# Altium footprint library cool_library.PcbLib: 1182 footprints (part 10 of 75)
Each footprint in its own frame and in the unit in brackets; x right, y up, seen from the top. Pads: shape width x height; smd on the part's side, far side on the other; paste and mask are expansions set on the pad; w line width, h text height; cw(c..) or ccw(c..) is an arc to the next point about the centre after c.
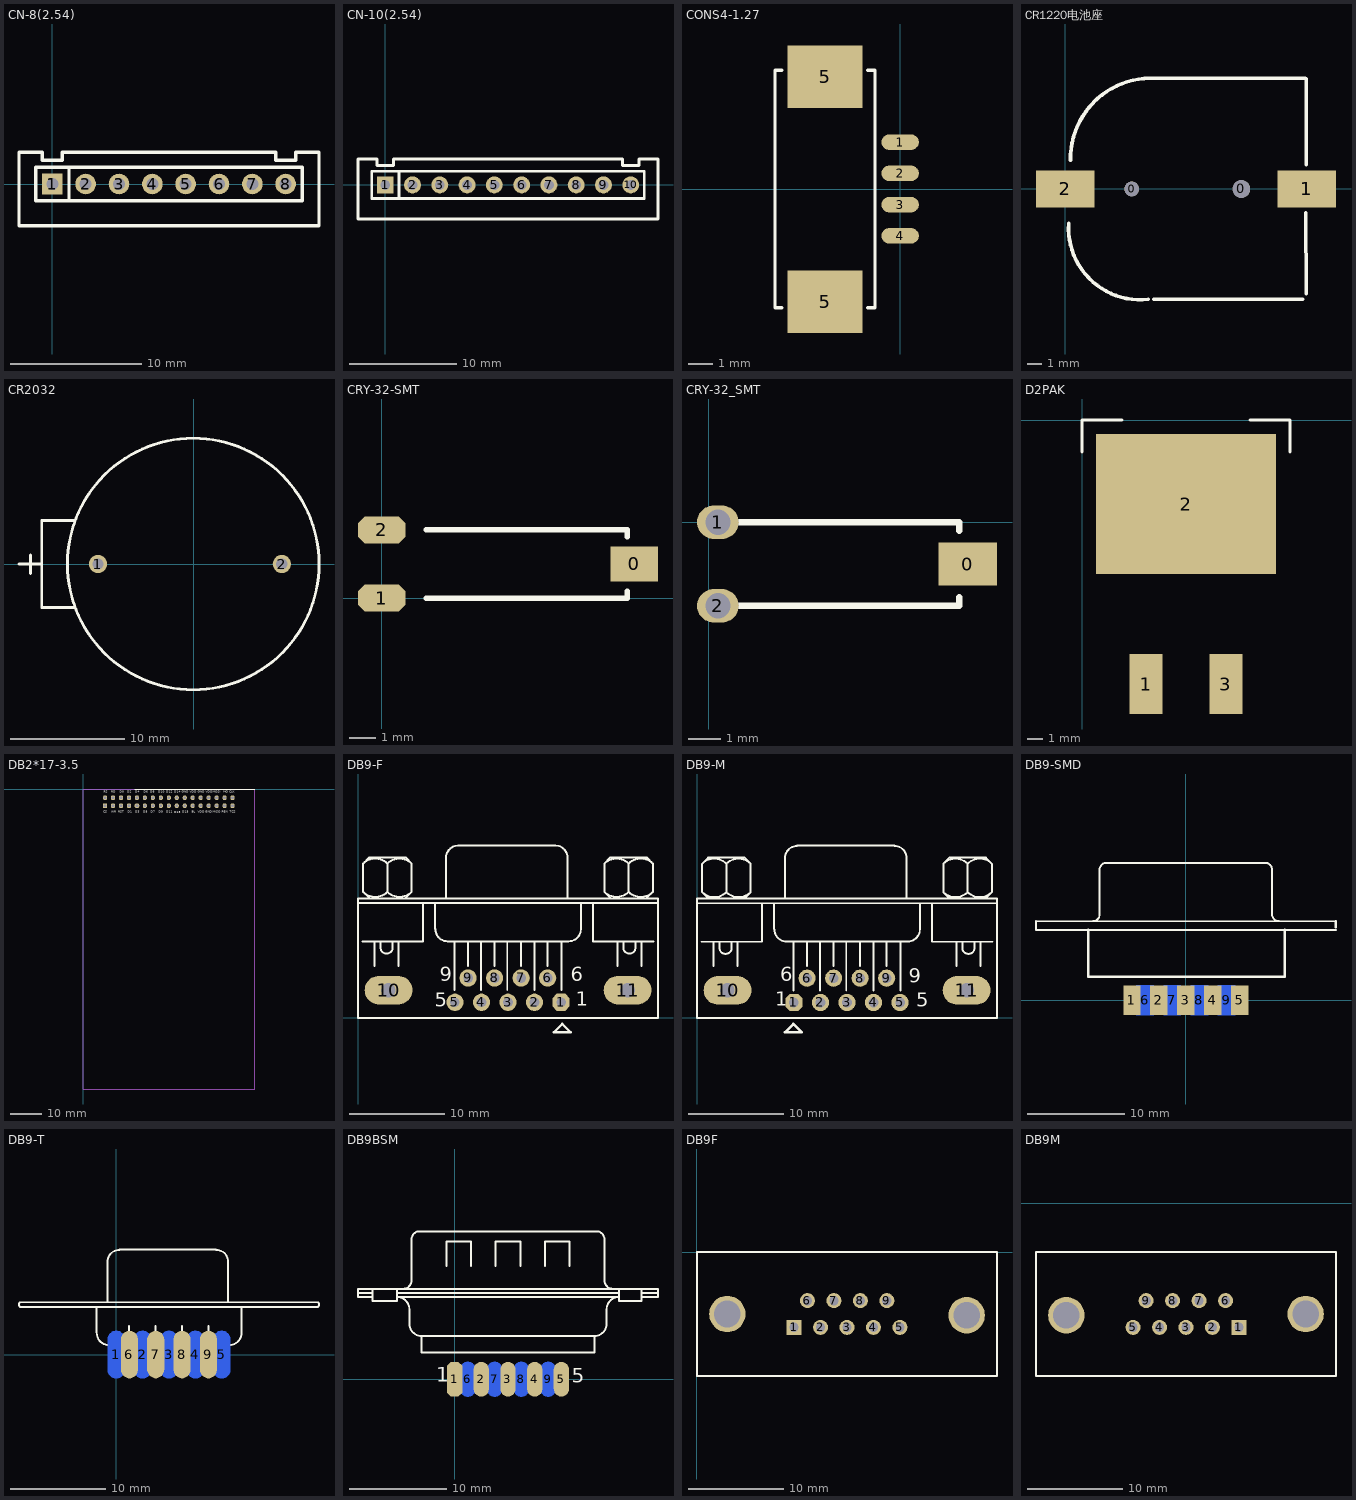
[diagram p9: the footprints below, top view; thin cyan lines are the x and y axes]

## CN-8(2.54) [mil]
pads (8):
  rect 62x62 hole 36: 1(0,0)
  round 62 hole 36: 2(100,0) 3(200,0) 4(300,0) 5(400,0) 6(500,0) 7(600,0) 8(700,0)
Top Overlay:
  lines w10: 50,-50 50,50 ; -100,-125 -100,95 -30,95 -30,71 30,71 30,95 670,95 670,71 730,71 730,95 800,95 800,-125 -100,-125 ; -50,-50 -50,50 750,50 750,-50 -50,-50

## CN-10(2.54) [mil]
pads (10):
  rect 62x62 hole 36: 1(0,0)
  round 62 hole 36: 2(100,0) 3(200,0) 4(300,0) 5(400,0) 6(500,0) 7(600,0) 8(700,0) 9(800,0) 10(900,0)
Top Overlay:
  lines w10: 50,-50 50,50 ; -100,-125 -100,95 -30,95 -30,71 30,71 30,95 870,95 870,71 930,71 930,95 1000,95 1000,-125 -100,-125 ; -50,-50 -50,50 950,50 950,-50 -50,-50

## CONS4-1.27 [mil]
height 135
pads (6):
  oval 60x25 smd: 1(0,75) 2(0,25) 3(0,-25) 4(0,-75)
  rect 120x100 smd: 5(-120,-180) 5(-120,180)
Top Overlay:
  lines w5: -189,-190 -200,-190 -200,190 -189,190 ; -52,-190 -40,-190 -40,190 -52,190

## CR1220电池座 [mm]
pads (4):
  round 1 hole 1: 0(4.547,0)
  round 1.2 hole 1.2: 0(12.04,0)
  rect 4x2.5 smd: 1(16.5,0) 2(0,0)
Top Overlay:
  lines w0.254: 0.229,-2.362 ccw(c5.134,-2.657) 5.666,-7.542 ; 0.356,1.981 cw(c5.867,2.057) 5.791,7.569 16.408,7.569 16.459,7.518 16.459,1.676 ; 6.045,-7.544 16.214,-7.544 ; 16.434,-1.626 16.459,-7.137

## CR2032 [mm]
pads (2):
  round 1.6 hole 1: 1(-8.382,0) 2(7.7,0)
Top Overlay:
  circle w0.254: c-0.05,0 r11
  lines w0.254: -15.291,0 -13.3,0 ; -14.3,-0.838 -14.3,0.787 ; -10.5,-3.8 -13.3,-3.8 -13.3,3.8 -10.5,3.8

## CRY-32-SMT [mil]
pads (3):
  rect 70x52 smd: 0(370,50)
  oct 70x40 smd: 1(0,0) 2(0,100)
Top Overlay:
  lines w8: 65,0 360,0 360,10 ; 65,100 360,100 360,90

## CRY-32_SMT [mil]
pads (3):
  rect 70x52 smd: 0(310,-50)
  oval 50x40 hole 30: 1(11,0) 2(11,-100)
Top Overlay:
  lines w8: 5,-100 300,-100 300,-90 ; 5,0 300,0 300,-10

## D2PAK [mil]
pads (3):
  rect 82x150 smd: 1(160,-660) 3(360,-660)
  rect 450x350 smd: 2(260,-210)
Top Overlay:
  lines w8: 0,-80 0,0 100,0 ; 420,0 520,0 520,-80

## DB2*17-3.5 [mil]
pads (34):
  rect 51.18x62 hole 35: 1(275,-210)
  oval 51.18x62 hole 35: 2(275,-110) 3(375,-210) 4(375,-110) 5(475,-210) 6(475,-110) 7(575,-210) 8(575,-110) 10(675,-110) 11(775,-210) 12(775,-110) 13(875,-210) 14(875,-110) 15(975,-210) 16(975,-110) 17(1075,-210) 18(1075,-110) 19(1175,-210) 20(1175,-110) 21(1275,-210) 22(1275,-110) 23(1375,-210) 24(1375,-110) 25(1475,-210) 26(1475,-110) 27(1575,-210) 28(1575,-110) 29(1675,-210) 30(1675,-110) 31(1775,-210) 32(1775,-110) 33(1875,-210) 34(1875,-110)
  round 62 hole 35: 9(675,-210)
Top Overlay:
  lines w10: 650,0 2155,0
  text "BL" at 1360,-300 h28
  text "MISO" at 1625,-300 h28.03
  text "TCS" at 1840,-300 h28.03
  text "MO" at 1757.28,-48.58 h28.03
  text "MOSI" at 1629.33,-48.58 h28.03
  text "CLK" at 1836.02,-48.58 h28.03
  text "PEN" at 1740,-300 h28.03
  text "D11" at 1045,-300 h28
  text "GND" at 1535,-300 h28
  text "GND" at 1240.55,-48.58 h28
  text "RD" at 354.72,-48.58 h28
  text "D0" at 458.07,-48.58 h28
  text "D10" at 940.35,-48.58 h28
  text "VDD" at 1338.98,-48.58 h28
  text "GND" at 1437.4,-48.58 h28
  text "VDD" at 1540.75,-48.58 h28
  text "VDD" at 1440,-300 h28
  text "D15" at 1245,-300 h28
  text "D12" at 1043.7,-48.58 h28
  text "D13" at 1142.13,-304.49 h28
  text "D9" at 950,-300 h28
  text "D8" at 841.93,-48.58 h28
  text "D6" at 758.27,-48.58 h28
  text "D5" at 755,-300 h28
  text "D4" at 654.92,-48.58 h28
  text "D3" at 655,-300 h28
  text "D2" at 556.5,-48.58 h28
  text "D1" at 560,-300 h28
  text "RST" at 440,-300 h28
  text "WR" at 355,-300 h28
  text "CS" at 255,-300 h28
  text "RS" at 256.3,-48.58 h28
  text "D7" at 850,-300 h28
  text "D14" at 1142.13,-48.58 h28
Bottom Overlay:
  lines w6: 225,-160 325,-160 325,-260 ; 225,-260 1925,-260 1925,-60 225,-60 225,-260
  lines w8: 235,-330 1925,-330
  text "CLK" at 1835,-275 h35
  text "TCS" at 1835,-350 h35
  text "NC" at 1750,-275 h35
  text "PEN" at 1725,-350 h35
  text "MO" at 1650,-275 h35
  text "MI" at 1655,-350 h35
  text "V5" at 1560,-275 h35
  text "GND" at 1530,-350 h35
  text "GND" at 1450,-275 h35
  text "VDD" at 1425,-350 h35
  text "VDD" at 1345,-275 h35
  text "BL" at 1350,-350 h35
  text "GND" at 1240,-275 h35
  text "D15" at 1240,-350 h35
  text "D14" at 1140,-275 h35
  text "D13" at 1135,-350 h35
  text "D12" at 1035,-275 h35
  text "D11" at 1035,-350 h35
  text "D10" at 935,-275 h35
  text "D9" at 945,-350 h35
  text "D8" at 850,-275 h35
  text "D7" at 850,-350 h35
  text "D6" at 755,-275 h35
  text "D5" at 755,-350 h35
  text "D4" at 650,-275 h35
  text "D3" at 650,-350 h35
  text "D2" at 550,-275 h35
  text "D1" at 555,-350 h35
  text "RST" at 435,-350 h35
  text "D0" at 450,-275 h35
  text "WR" at 350,-350 h35
  text "RD" at 350,-275 h35
  text "RS" at 245,-275 h35
  text "CS" at 240,-350 h35
Mechanical 7:
  lines w10: 650,0 0,0 0,-3765 2155,-3765 2155,0
3D body: height 200, standoff 0, extent 1845.31,-142 1905.08,-82.12
3D body: height 200, standoff 0, extent 1846.31,-241 1906.08,-181.12
3D body: height 200, standoff 0, extent 1042.31,-241 1102.08,-181.12
3D body: height 200, standoff 0, extent 1143.31,-241 1203.08,-181.12
3D body: height 200, standoff 0, extent 1242.31,-241 1302.08,-181.12
3D body: height 200, standoff 0, extent 1544.31,-242 1604.08,-182.12
3D body: height 200, standoff 0, extent 1445.31,-242 1505.08,-182.12
3D body: height 200, standoff 0, extent 1344.31,-242 1404.08,-182.12
3D body: height 200, standoff 0, extent 1744.31,-242 1804.08,-182.12
3D body: height 200, standoff 0, extent 1643.31,-242 1703.08,-182.12
3D body: height 200, standoff 0, extent 1642.31,-143 1702.08,-83.12
3D body: height 200, standoff 0, extent 1743.31,-143 1803.08,-83.12
3D body: height 200, standoff 0, extent 1343.31,-143 1403.08,-83.12
3D body: height 200, standoff 0, extent 1444.31,-143 1504.08,-83.12
3D body: height 200, standoff 0, extent 1543.31,-143 1603.08,-83.12
3D body: height 200, standoff 0, extent 1241.31,-142 1301.08,-82.12
3D body: height 200, standoff 0, extent 1142.31,-142 1202.08,-82.12
3D body: height 200, standoff 0, extent 1041.31,-142 1101.08,-82.12
3D body: height 200, standoff 0, extent 245.31,-239 305.08,-179.12
3D body: height 200, standoff 0, extent 346.31,-239 406.08,-179.12
3D body: height 200, standoff 0, extent 445.31,-239 505.08,-179.12
3D body: height 200, standoff 0, extent 747.31,-240 807.08,-180.12
3D body: height 200, standoff 0, extent 648.31,-240 708.08,-180.12
3D body: height 200, standoff 0, extent 547.31,-240 607.08,-180.12
3D body: height 200, standoff 0, extent 947.31,-240 1007.08,-180.12
3D body: height 200, standoff 0, extent 846.31,-240 906.08,-180.12
3D body: height 200, standoff 0, extent 845.31,-141 905.08,-81.12
3D body: height 200, standoff 0, extent 946.31,-141 1006.08,-81.12
3D body: height 200, standoff 0, extent 546.31,-141 606.08,-81.12
3D body: height 200, standoff 0, extent 647.31,-141 707.08,-81.12
3D body: height 200, standoff 0, extent 746.31,-141 806.08,-81.12
3D body: height 200, standoff 0, extent 444.31,-140 504.08,-80.12
3D body: height 200, standoff 0, extent 345.31,-140 405.08,-80.12
3D body: height 200, standoff 0, extent 244.31,-140 304.08,-80.12
3D body: height 10, standoff 0, extent 230,-255 1925,-65.18

## DB9-F [mm]
pads (11):
  oct 1.8x1.8 hole 1: 1(21.209,1.626)
  round 1.8 hole 1: 2(18.436,1.626) 3(15.663,1.626) 4(12.89,1.626) 5(10.118,1.626) 6(19.812,4.166) 7(17.039,4.166) 8(14.266,4.166) 9(11.493,4.166)
  oval 5x3 hole 1.5: 10(3.175,2.896) 11(28.173,2.896)
Top Overlay:
  lines w0.203: 0,12 31.327,12 ; 0.423,7.976 6.773,7.976 6.773,12 ; 0.506,13.163 ccw(c1.778,14.436) 3.05,13.163 ; 0.506,16.131 cw(c1.778,14.859) 3.05,16.131 ; 1.143,12.531 0.508,13.166 0.508,16.129 1.143,16.764 4.953,16.764 5.588,16.129 ; 1.693,5.436 1.693,7.976 ; 2.328,7.976 2.328,7.341 ccw(c2.963,7.341) 3.598,7.341 3.598,7.976 ; 3.044,16.125 3.048,13.166 ; 3.046,13.163 ccw(c4.318,14.436) 5.59,13.163 ; 3.046,16.131 cw(c4.318,14.859) 5.59,16.131 5.588,13.166 4.953,12.531 ; 4.233,5.436 4.233,7.976 ; 8.043,9.296 8.043,12 ; 8.069,9.271 ccw(c9.339,9.271) 9.339,8.001 ; 9.186,12.522 9.186,16.789 ; 9.186,16.739 cw(c10.456,16.739) 10.456,18.009 ; 9.313,8 22.013,8 ; 10.058,2.896 10.058,8 ; 10.456,18 20.616,18 ; 11.464,5.436 11.464,8 ; 12.861,2.896 12.861,8 ; 14.266,5.436 14.266,8 ; 15.587,2.896 15.587,8 ; 17.018,5.436 17.018,8 ; 18.415,2.896 18.415,8 ; 19.795,5.436 19.795,8 ; 20.616,18.009 cw(c20.616,16.739) 21.886,16.739 ; 21.268,2.896 21.268,8 ; 21.886,12.522 21.886,16.789 ; 22.013,8.001 ccw(c22.013,9.271) 23.283,9.271 ; 23.283,9.246 23.283,12 ; 24.553,12 24.553,7.976 30.903,7.976 ; 25.736,13.163 ccw(c27.009,14.436) 28.281,13.163 ; 25.739,16.129 26.374,16.764 30.184,16.764 30.819,16.129 30.819,13.166 30.184,12.531 ; 26.374,12.531 25.739,13.166 25.736,16.131 cw(c27.009,14.859) 28.281,16.131 ; 27.093,5.436 27.093,7.976 ; 27.728,7.976 27.728,7.341 ccw(c28.363,7.341) 28.998,7.341 28.998,7.976 ; 28.276,13.163 ccw(c29.549,14.436) 30.821,13.163 ; 28.276,16.131 cw(c29.549,14.859) 30.821,16.131 ; 28.279,13.166 28.283,16.125 ; 29.633,5.436 29.633,7.976 ; 0,0 0,12.5 31.327,12.5 31.327,0 0,0
  lines w0.254: 20.447,-1.524 22.225,-1.524 21.336,-0.635 20.447,-1.524
  text "6" at 22.225,3.81 h1.5
  text "1" at 22.733,1.27 h1.5
  text "5" at 8.001,1.143 h1.5
  text "9" at 8.509,3.81 h1.5

## DB9-M [mm]
pads (11):
  oct 1.8x1.8 hole 1: 1(10.092,1.6)
  round 1.8 hole 1: 2(12.865,1.6) 3(15.638,1.6) 4(18.411,1.6) 5(21.184,1.6) 6(11.468,4.14) 7(14.241,4.14) 8(17.014,4.14) 9(19.787,4.14)
  oval 5x3 hole 1.5: 10(3.15,2.87) 11(28.147,2.87)
Top Overlay:
  lines w0.203: -0.025,11.975 31.301,11.975 ; 0.398,7.95 6.748,7.95 6.748,11.975 ; 0.48,13.138 ccw(c1.753,14.41) 3.025,13.138 ; 0.48,16.106 cw(c1.753,14.834) 3.025,16.106 ; 1.118,12.505 0.483,13.14 0.483,16.104 1.118,16.739 4.928,16.739 5.563,16.104 ; 1.668,5.41 1.668,7.95 ; 2.303,7.95 2.303,7.315 ccw(c2.938,7.315) 3.573,7.315 3.573,7.95 ; 3.018,16.1 3.023,13.14 ; 3.02,13.138 ccw(c4.293,14.41) 5.565,13.138 ; 3.02,16.106 cw(c4.293,14.834) 5.565,16.106 5.563,13.14 4.928,12.505 ; 4.208,5.41 4.208,7.95 ; 8.018,9.271 8.018,11.975 ; 8.043,9.246 ccw(c9.313,9.246) 9.313,7.976 ; 9.161,12.497 9.161,16.764 ; 9.161,16.713 cw(c10.431,16.713) 10.431,17.983 ; 9.288,7.975 21.988,7.975 ; 10.033,2.87 10.033,7.975 ; 10.431,18 20.591,18 ; 11.438,5.41 11.438,7.975 ; 12.835,2.87 12.835,7.975 ; 14.241,5.41 14.241,7.975 ; 15.562,2.87 15.562,7.975 ; 16.993,5.41 16.993,7.975 ; 18.39,2.87 18.39,7.975 ; 19.77,5.41 19.77,7.975 ; 20.591,17.983 cw(c20.591,16.713) 21.861,16.713 ; 21.243,2.87 21.243,7.975 ; 21.861,12.497 21.861,16.764 ; 21.988,7.976 ccw(c21.988,9.246) 23.258,9.246 ; 23.258,9.22 23.258,11.975 ; 24.528,11.975 24.528,7.95 30.878,7.95 ; 25.711,13.138 ccw(c26.983,14.41) 28.255,13.138 ; 25.713,16.104 26.348,16.739 30.158,16.739 30.793,16.104 30.793,13.14 30.158,12.505 ; 26.348,12.505 25.713,13.14 25.711,16.106 cw(c26.983,14.834) 28.255,16.106 ; 27.068,5.41 27.068,7.95 ; 27.703,7.95 27.703,7.315 ccw(c28.338,7.315) 28.973,7.315 28.973,7.95 ; 28.251,13.138 ccw(c29.523,14.41) 30.795,13.138 ; 28.251,16.106 cw(c29.523,14.834) 30.795,16.106 ; 28.253,13.14 28.258,16.1 ; 29.608,5.41 29.608,7.95 ; -0.025,-0.025 -0.025,12.475 31.301,12.475 31.301,-0.025 -0.025,-0.025
  lines w0.254: 9.144,-1.524 10.922,-1.524 10.033,-0.635 9.144,-1.524
  text "9" at 22.098,3.683 h1.5
  text "5" at 22.86,1.143 h1.5
  text "1" at 8.128,1.27 h1.5
  text "6" at 8.636,3.81 h1.5

## DB9-SMD [mil]
height 100
pads (9):
  rect 70x120 smd: 1(-218.11,-0.04) 2(-109.05,-0.04) 3(0,-0.04) 4(109.06,-0.04) 5(218.11,-0.04)
  rect 70x120 smd far side: 6(-165,0.04) 7(-55,0.04) 8(55,0.04) 9(165,0.04)
Top Overlay:
  lines w7.87: -606.3,320.04 606.3,320.04 ; -605,285.04 607.6,285.04 ; -376.38,320.24 ccw(c-376.38,347.6) -349.02,347.6 -349.02,528.7 ; -348.82,528.9 cw(c-321.46,528.9) -321.46,556.26 321.46,556.26 cw(c321.46,528.9) 348.82,528.9 ; 349.02,528.7 349.02,347.6 ccw(c376.38,347.6) 376.38,320.24
  lines w10: -606.3,320.04 -606.3,286.34 -605,285.04 ; -395,285.04 -395,95.04 400,95.04 400,285.04 ; 606.3,320.04 606.3,296.34 607.6,295.04

## DB9-T [mm]
pads (9):
  oval 1.8x5 smd far side: 1(0,0) 2(2.773,0) 3(5.546,0) 4(8.319,0) 5(11.091,0)
  oval 1.8x5 smd: 6(1.389,0) 7(4.149,0) 8(6.921,0) 9(9.694,0)
Top Overlay:
  lines w0.2: -10.118,5 cw(c-9.868,5.25) -10.118,5.5 ; 21.209,5 ccw(c20.959,5.25) 21.209,5.5
  lines w0.203: -10.118,5 21.209,5 ; -10.118,5.5 21.209,5.5 ; -2.074,2.296 -2.074,5 ; -2.049,2.271 ccw(c-0.779,2.271) -0.779,1.001 ; -0.931,5.522 -0.931,9.789 ; -0.931,9.739 cw(c0.339,9.739) 0.339,11.009 ; -0.804,1 11.896,1 ; 0.339,11.025 10.499,11.025 ; 1.346,1 1.346,3 ; 4.149,1 4.149,3 ; 6.9,1 6.9,3 ; 9.677,1 9.677,3 ; 10.499,11.009 cw(c10.499,9.739) 11.769,9.739 ; 11.769,5.522 11.769,9.789 ; 11.896,1.001 ccw(c11.896,2.271) 13.166,2.271 ; 13.166,2.246 13.166,5
  text "9" at 11.108,-0.715 h1
  text "6" at -0.601,-0.766 h1
Bottom Overlay:
  lines w0.203: -0.059,1 -0.059,3 ; 2.743,1 2.743,3 ; 5.469,1 5.469,3 ; 8.297,1 8.297,3 ; 11.151,1 11.151,3
  text "5" at 12.81,-0.766 h1
  text "1" at -1.185,-0.766 h1

## DB9BSM [mil]
pads (9):
  oct 62.5x141.67 smd: 1(0,0)
  oval 62.5x141.67 smd: 2(108.33,0) 3(216.67,0) 4(325,0) 5(433.33,0)
  oval 62.5x141.67 smd far side: 6(54.17,0) 7(162.5,0) 8(270.83,0) 9(379.17,0)
Top Overlay:
  lines w8: -391.67,350 -333.33,350 ; -333.33,333.33 -391.67,333.33 -391.67,366.67 825,366.67 825,333.33 758.33,333.33 ; -333.33,366.67 -333.33,316.67 -233.33,316.67 -233.33,366.67 ; -233.33,350 666.67,350 ; -208.33,366.67 ccw(c-208.33,400) -175,400 -175,566.67 cw(c-141.67,566.67) -141.67,600 575,600 cw(c575,566.67) 608.33,566.67 608.33,400 ccw(c641.67,400) 641.67,366.67 ; -33.33,458.33 -33.33,558.33 66.67,558.33 66.67,458.33 ; 166.67,458.33 166.67,558.33 266.67,558.33 266.67,458.33 ; 366.67,458.33 366.67,558.33 466.67,558.33 466.67,458.33 ; 666.67,366.67 666.67,316.67 758.33,316.67 758.33,366.67 ; 758.33,350 825,350 ; -133.33,175 cw(c-133.33,225) -183.33,225 -183.33,283.33 ccw(c-233.33,283.33) -233.33,333.33 666.67,333.33 ccw(c666.67,283.33) 616.67,283.33 616.67,225 cw(c566.67,225) 566.67,175 ; -133.33,175 -133.33,108.33 566.67,108.33 566.67,175 ; -133.33,175 566.67,175
  text "1" at -75,-10 h59.06
  text "5" at 475,-15 h59.06
Bottom Overlay:
  text "9" at 475,-15 h59.06
  text "6" at -15,-10 h59.06

## DB9F [mil]
pads (11):
  rect 62x62 hole 38: 1(401,-310)
  round 62 hole 38: 2(510,-310) 3(619,-310) 4(728,-310) 5(837,-310) 6(456,-200) 7(565,-200) 8(674,-200) 9(783,-200)
  round 150 hole 110: ""(126,-255) ""(1112,-260)
Top Overlay:
  lines w8: 1,-510 1,0 1237,0 1237,-510 1,-510

## DB9M [mil]
pads (11):
  rect 62x62 hole 38: 1(1038,-512)
  round 62 hole 38: 2(929,-512) 3(820,-512) 4(711,-512) 5(602,-512) 6(983,-402) 7(874,-402) 8(765,-402) 9(656,-402)
  round 150 hole 110: ""(327,-462) ""(1313,-457)
Top Overlay:
  lines w8: 202,-712 202,-202 1438,-202 1438,-712 202,-712